# Altium footprint library Elettronica FM.PcbLib: 387 footprints (part 10 of 25)
Each footprint in its own frame and in the unit in brackets; x right, y up, seen from the top. Pads: shape width x height; smd on the part's side, far side on the other; paste and mask are expansions set on the pad; w line width, h text height; cw(c..) or ccw(c..) is an arc to the next point about the centre after c.
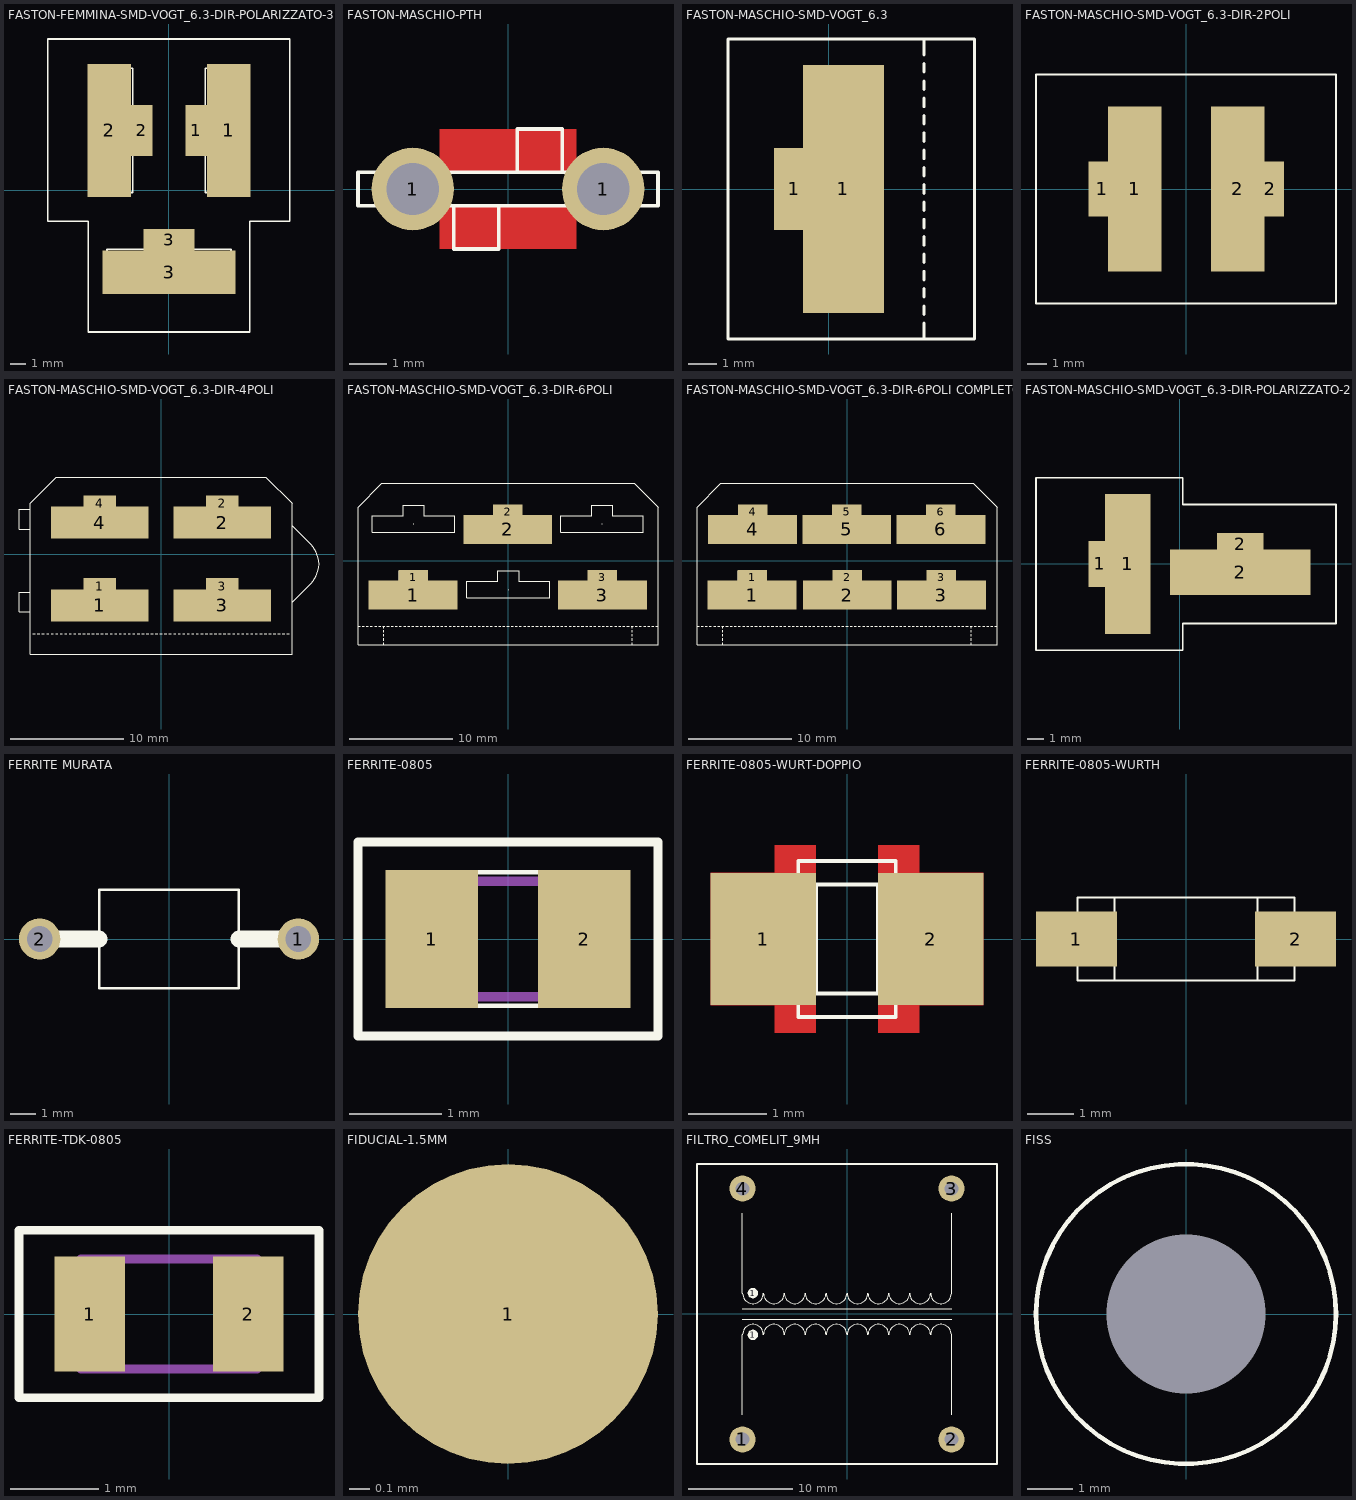
[diagram p9: the footprints below, top view; thin cyan lines are the x and y axes]

## FASTON-FEMMINA-SMD-VOGT_6.3-DIR-POLARIZZATO-3POLI [mm]
height 40.5
pads (9):
  round 0.1 on Top Overlay mask+0.1: 0(3.15,3.85) 1(-3.15,3.85) 1(0,-4.6)
  rect 1.4x3.3 smd paste-5 mask+0.1: 1(1.75,3.85) 2(-1.75,3.85)
  rect 2.8x8.6 smd paste-5 mask+0.1: 1(3.85,3.85) 2(-3.85,3.85)
  rect 8.6x2.8 smd paste-5 mask+0.1: 3(0,-5.3)
  rect 3.3x1.4 smd paste-5 mask+0.1: 3(0,-3.2)
Top Overlay:
  lines w0.1: -3.55,2.5 -4.95,2.5 -4.95,1.525 -4.45,1.525 cw(c-4.45,1.175) -4.45,0.825 -4.95,0.825 -4.95,-0.15 -3.55,-0.15 ; -3.55,5.2 -4.95,5.2 -4.95,6.175 -4.45,6.175 ccw(c-4.45,6.525) -4.45,6.875 -4.95,6.875 -4.95,7.85 -3.55,7.85 ; -2.75,2.525 -1.35,2.525 -1.35,3.5 -1.85,3.5 cw(c-1.85,3.85) -1.85,4.2 -1.35,4.2 -1.35,5.175 -2.75,5.175 ; -1.35,-5 -1.35,-6.4 -2.325,-6.4 -2.325,-5.9 ccw(c-2.675,-5.9) -3.025,-5.9 -3.025,-6.4 -4,-6.4 -4,-5 ; -1.325,-4.2 -1.325,-2.8 -0.35,-2.8 -0.35,-3.3 ccw(c0,-3.3) 0.35,-3.3 0.35,-2.8 1.325,-2.8 1.325,-4.2 ; 1.35,-5 1.35,-6.4 2.325,-6.4 2.325,-5.9 cw(c2.675,-5.9) 3.025,-5.9 3.025,-6.4 4,-6.4 4,-5 ; 2.35,2.85 1.35,2.85 1.35,4.85 2.35,4.85 ; 2.35,2.85 2.35,-0.15 3.95,-0.15 3.95,7.85 2.35,7.85 2.35,4.85 ; 2.75,2.525 1.35,2.525 1.35,3.5 1.85,3.5 ccw(c1.85,3.85) 1.85,4.2 1.35,4.2 1.35,5.175 2.75,5.175 ; 3.55,2.5 4.95,2.5 4.95,1.525 4.45,1.525 ccw(c4.45,1.175) 4.45,0.825 4.95,0.825 4.95,-0.15 3.55,-0.15 ; 3.55,5.2 4.95,5.2 4.95,6.175 4.45,6.175 cw(c4.45,6.525) 4.45,6.875 4.95,6.875 4.95,7.85 3.55,7.85 ; -4,-5 -4,-4.2 ; -4,-5 4,-5 ; -4,-5 -4,-4.2 ; -4,-4.2 4,-4.2 ; -3.55,-0.15 -2.75,-0.15 ; -3.55,-0.15 -3.55,7.85 ; -3.55,-0.15 -2.75,-0.15 ; -3.55,7.85 -2.75,7.85 ; -3.55,7.85 -2.75,7.85 ; -2.75,-0.15 -2.75,7.85 ; 2.75,-0.15 3.55,-0.15 ; 2.75,-0.15 2.75,7.85 ; 2.75,-0.15 3.55,-0.15 ; 2.75,7.85 3.55,7.85 ; 2.75,7.85 3.55,7.85 ; 3.55,-0.15 3.55,7.85 ; 4,-5 4,-4.2 ; 4,-5 4,-4.2 ; -7.825,-2 -5.2,-2 -5.2,-9.15 5.2,-9.15 5.2,-2 7.8,-2 7.8,9.75 -7.825,9.75 -7.825,-2 ; -4,-5.4 4,-5.4 4,-3.8 1,-3.8 1,-2.8 -1,-2.8 -1,-3.8 -4,-3.8 -4,-5.4 ; -3.95,-0.15 -2.35,-0.15 -2.35,2.85 -1.35,2.85 -1.35,4.85 -2.35,4.85 -2.35,7.85 -3.95,7.85 -3.95,-0.15
3D body "c-180941-p5-3d.stp": height 24.3, standoff 1.5, extent -7.6,-8.95 7.6,9.55
3D body "450.STEP": height 10.3, standoff 0, extent -5,-0.15 -1.3,7.85
3D body "450.STEP": height 10.3, standoff 0, extent 1.3,-0.15 5,7.85
3D body "450.STEP": height 10.3, standoff 0, extent -4,-6.45 4,-2.75

## FASTON-MASCHIO-PTH [mm]
height 40.5
pads (2):
  round 2.2 hole 1.4 paste+0 mask+0.05: 1(-2.54,0) 1(2.54,0)
Top Layer:
  pour cut-out: -1.825,0.45 -1.825,1.6 1.825,1.6 1.825,0.45
  pour cut-out: 1.825,-0.45 1.825,-1.6 -1.825,-1.6 -1.825,-0.45
Top Overlay:
  lines w0.1: -1.825,-0.45 -1.825,-0.3 ; -1.825,-0.075 -1.825,0.075 ; -1.825,0.3 -1.825,0.45 ; -1.45,-0.45 -1.45,-1.6 -0.25,-1.6 -0.25,-0.45 ; 0.25,0.45 0.25,1.6 1.45,1.6 1.45,0.45 ; 1.825,-0.45 1.825,-0.3 ; 1.825,-0.075 1.825,0.075 ; 1.825,0.3 1.825,0.45 ; -3.25,-0.45 -4,-0.45 -4,0.45 -3.25,0.45 ; -3.25,-0.45 3.25,-0.45 ; -3.25,-0.45 -3.25,0.45 ; -3.25,0.45 3.25,0.45 ; 3.25,-0.45 4,-0.45 4,0.45 3.25,0.45 ; 3.25,-0.45 3.25,0.45
3D body "c-1217861-1-h-3d.stp": height 10.55, standoff -3.47, extent -3.962,-1.543 3.963,1.543

## FASTON-MASCHIO-SMD-VOGT_6.3 [mm]
height 40.5
pads (3):
  rect 1.4x2.85 smd paste-5 mask-50: 1(-1.2,0)
  rect 2.8x8.6 smd paste-5 mask-50: 1(0.5,0)
  round 0.1 on Top Overlay mask+0.1: 2(0,0)
Top Overlay:
  lines w0.1: -0.425,-1.325 -1.825,-1.325 -1.825,-0.35 -1.325,-0.35 ccw(c-1.325,0) -1.325,0.35 -1.825,0.35 -1.825,1.325 -0.425,1.325 ; 0.375,-1.35 1.775,-1.35 1.775,-2.325 1.275,-2.325 ccw(c1.275,-2.675) 1.275,-3.025 1.775,-3.025 1.775,-4 0.375,-4 ; 0.375,1.35 1.775,1.35 1.775,2.325 1.275,2.325 cw(c1.275,2.675) 1.275,3.025 1.775,3.025 1.775,4 0.375,4 ; 3.3,-4.65 3.3,-5.2 ; 3.3,-4.35 3.3,-4.05 ; 3.3,-3.75 3.3,-3.45 ; 3.3,-3.15 3.3,-2.85 ; 3.3,-2.55 3.3,-2.25 ; 3.3,-1.95 3.3,-1.65 ; 3.3,-1.35 3.3,-1.05 ; 3.3,-0.75 3.3,-0.45 ; 3.3,-0.15 3.3,0.15 ; 3.3,0.45 3.3,0.75 ; 3.3,1.05 3.3,1.35 ; 3.3,1.65 3.3,1.95 ; 3.3,2.25 3.3,2.55 ; 3.3,2.85 3.3,3.15 ; 3.3,3.45 3.3,3.75 ; 3.3,4.05 3.3,4.35 ; 3.3,4.65 3.3,5.2 ; -0.425,-4 0.375,-4 ; -0.425,-4 0.375,-4 ; -0.425,-4 -0.425,4 ; -0.425,4 0.375,4 ; -0.425,4 0.375,4 ; 0.375,-4 0.375,4 ; 3.3,-5.2 5.05,-5.2 5.05,5.2 3.3,5.2 ; 3.3,-5.2 -3.5,-5.2 -3.5,5.2 3.3,5.2
Top Paste:
  region: -0.9,4.3 1.9,4.3 1.9,-4.3 -0.9,-4.3 -0.9,-1.425 -1.9,-1.425 -1.9,1.4 -1.9,1.425 -1.875,1.425 -0.9,1.425
Top Solder:
  region: -1.95,1.475 -1,1.475 -1,4.4 1.95,4.4 1.95,-4.4 -1,-4.4 -1,-1.475 -1.95,-1.475
3D body "c-0480054-03-3-u-3d.stp": height 25.5, standoff 1.5, extent -3.303,-4.994 4.825,4.975
3D body "450.STEP": height 10.3, standoff 0, extent -1.825,-4 1.875,4

## FASTON-MASCHIO-SMD-VOGT_6.3-DIR-2POLI [mm]
height 40.5
pads (6):
  rect 1.4x2.85 smd paste-5 mask-50: 1(-4.363,0) 2(4.387,0)
  rect 2.8x8.6 smd paste-5 mask-50: 1(-2.663,0) 2(2.687,0)
  round 0.1 on Top Overlay mask+0.1: 2(-3.163,0) 2(3.187,0)
Top Overlay:
  lines w0.1: -3.587,-1.325 -4.987,-1.325 -4.987,-0.35 -4.487,-0.35 ccw(c-4.487,0) -4.487,0.35 -4.987,0.35 -4.987,1.325 -3.587,1.325 ; -2.787,-1.35 -1.387,-1.35 -1.387,-2.325 -1.887,-2.325 ccw(c-1.887,-2.675) -1.887,-3.025 -1.387,-3.025 -1.387,-4 -2.787,-4 ; -2.787,1.35 -1.387,1.35 -1.387,2.325 -1.887,2.325 cw(c-1.887,2.675) -1.887,3.025 -1.387,3.025 -1.387,4 -2.787,4 ; 2.787,-1.35 1.387,-1.35 1.387,-2.325 1.887,-2.325 cw(c1.887,-2.675) 1.887,-3.025 1.387,-3.025 1.387,-4 2.787,-4 ; 2.787,1.35 1.387,1.35 1.387,2.325 1.887,2.325 ccw(c1.887,2.675) 1.887,3.025 1.387,3.025 1.387,4 2.787,4 ; 3.587,-1.325 4.987,-1.325 4.987,-0.35 4.487,-0.35 cw(c4.487,0) 4.487,0.35 4.987,0.35 4.987,1.325 3.587,1.325 ; -3.587,-4 -3.587,4 ; -3.587,-4 -2.787,-4 ; -3.588,-4 -2.788,-4 ; -3.587,4 -2.787,4 ; -3.588,4 -2.788,4 ; -2.787,-4 -2.787,4 ; -2.363,1 -2.363,4 -3.963,4 -3.963,-4 -2.363,-4 -2.363,-1 -1.362,-1 -1.362,1 -2.362,1 ; -2.363,1 -2.362,1 ; 2.787,-4 3.587,-4 ; 2.787,-4 2.787,4 ; 2.788,-4 3.588,-4 ; 2.787,4 3.587,4 ; 2.788,4 3.588,4 ; 3.587,-4 3.587,4 ; -7.8,-5.95 7.8,-5.95 7.8,5.95 -7.8,5.95 -7.8,-5.95 ; 2.387,-4 3.987,-4 3.987,-1 4.988,-1 4.988,1 3.988,1 3.987,4 2.387,4 2.387,-4
Top Paste:
  region: 4.087,-4.3 1.287,-4.3 1.287,4.3 4.087,4.3 4.087,1.425 5.087,1.425 5.087,-1.4 5.087,-1.425 5.062,-1.425 4.087,-1.425
  region: -4.063,-4.3 -1.263,-4.3 -1.263,4.3 -4.063,4.3 -4.063,1.425 -5.063,1.425 -5.063,-1.4 -5.063,-1.425 -5.038,-1.425 -4.063,-1.425
Top Solder:
  region: 5.137,-1.475 4.187,-1.475 4.187,-4.4 1.237,-4.4 1.237,4.4 4.187,4.4 4.187,1.475 5.137,1.475
  region: -5.113,-1.475 -4.163,-1.475 -4.163,-4.4 -1.213,-4.4 -1.213,4.4 -4.163,4.4 -4.163,1.475 -5.113,1.475
3D body "450.STEP": height 10.3, standoff 0, extent -5.037,-4 -1.337,4
3D body "450.STEP": height 10.3, standoff 0, extent 1.337,-4 5.037,4
3D body "c-180923-ah-3d.stp": height 24.4, standoff 1.5, extent -7.6,-5.75 7.6,5.75

## FASTON-MASCHIO-SMD-VOGT_6.3-DIR-4POLI [mm]
height 40.5
pads (16):
  rect 2.85x1.4 smd paste-5 mask-50: 1(-5.4,-2.8) 2(5.4,4.5) 3(5.4,-2.8) 4(-5.4,4.5)
  rect 8.6x2.8 smd paste-5 mask-50: 1(-5.4,-4.5) 2(5.4,2.8) 3(5.4,-4.5) 4(-5.4,2.8)
  round 0.1 on Top Overlay mask+0.1: 2(-5.4,-4) 2(-5.4,-4) 2(-5.4,3.3) 2(5.4,-4) 2(5.4,-4) 2(5.4,-4) 2(5.4,3.3) 2(5.4,3.3)
Top Overlay:
  drawing of 212 lines, arcs and shapes, not listed
Top Paste:
  region: -1.1,4.2 -1.1,1.4 -9.7,1.4 -9.7,4.2 -6.825,4.2 -6.825,5.2 -4,5.2 -3.975,5.2 -3.975,5.175 -3.975,4.2
  region: 9.7,4.2 9.7,1.4 1.1,1.4 1.1,4.2 3.975,4.2 3.975,5.2 6.8,5.2 6.825,5.2 6.825,5.175 6.825,4.2
  region: -1.1,-3.1 -1.1,-5.9 -9.7,-5.9 -9.7,-3.1 -6.825,-3.1 -6.825,-2.1 -4,-2.1 -3.975,-2.1 -3.975,-2.125 -3.975,-3.1
  region: 9.7,-3.1 9.7,-5.9 1.1,-5.9 1.1,-3.1 3.975,-3.1 3.975,-2.1 6.8,-2.1 6.825,-2.1 6.825,-2.125 6.825,-3.1
Top Solder:
  region: -3.925,5.25 -3.925,4.3 -1,4.3 -1,1.35 -9.8,1.35 -9.8,4.3 -6.875,4.3 -6.875,5.25
  region: 6.875,5.25 6.875,4.3 9.8,4.3 9.8,1.35 1,1.35 1,4.3 3.925,4.3 3.925,5.25
  region: -3.925,-2.05 -3.925,-3 -1,-3 -1,-5.95 -9.8,-5.95 -9.8,-3 -6.875,-3 -6.875,-2.05
  region: 6.875,-2.05 6.875,-3 9.8,-3 9.8,-5.95 1,-5.95 1,-3 3.925,-3 3.925,-2.05
3D body "c-880110-f-3d.stp": height 25.65, standoff 1.5, extent -12.315,-8.72 13.715,6.72
3D body "450.STEP": height 10.3, standoff 0, extent -9.4,1.45 -1.4,5.15
3D body "450.STEP": height 10.3, standoff 0, extent 1.4,1.45 9.4,5.15
3D body "450.STEP": height 10.3, standoff 0, extent -9.4,-5.85 -1.4,-2.15
3D body "450.STEP": height 10.3, standoff 0, extent 1.4,-5.85 9.4,-2.15

## FASTON-MASCHIO-SMD-VOGT_6.3-DIR-6POLI [mm]
height 40.5
pads (12):
  rect 2.85x1.4 smd paste-5 mask-50: 1(-9.175,-1.625) 2(-0.025,4.725) 3(9.125,-1.625)
  rect 8.6x2.8 smd paste-5 mask-50: 1(-9.175,-3.325) 2(-0.025,3.025) 3(9.125,-3.325)
  round 0.1 on Top Overlay mask+0.1: 2(-9.175,-2.825) 2(-9.125,3.525) 2(-0.025,3.525) 2(0.025,-2.825) 2(9.075,3.525) 2(9.125,-2.825)
Top Overlay:
  drawing of 218 lines, arcs and shapes, not listed
Top Paste:
  region: 13.425,-1.925 13.425,-4.725 4.825,-4.725 4.825,-1.925 7.7,-1.925 7.7,-0.925 10.525,-0.925 10.55,-0.925 10.55,-0.95 10.55,-1.925
  region: 4.275,4.425 4.275,1.625 -4.325,1.625 -4.325,4.425 -1.45,4.425 -1.45,5.425 1.375,5.425 1.4,5.425 1.4,5.4 1.4,4.425
  region: -4.875,-1.925 -4.875,-4.725 -13.475,-4.725 -13.475,-1.925 -10.6,-1.925 -10.6,-0.925 -7.775,-0.925 -7.75,-0.925 -7.75,-0.95 -7.75,-1.925
Top Solder:
  region: 10.6,-0.875 10.6,-1.825 13.525,-1.825 13.525,-4.775 4.725,-4.775 4.725,-1.825 7.65,-1.825 7.65,-0.875
  region: 1.45,5.475 1.45,4.525 4.375,4.525 4.375,1.575 -4.425,1.575 -4.425,4.525 -1.5,4.525 -1.5,5.475
  region: -7.7,-0.875 -7.7,-1.825 -4.775,-1.825 -4.775,-4.775 -13.575,-4.775 -13.575,-1.825 -10.65,-1.825 -10.65,-0.875
3D body "450.STEP": height 10.3, standoff 0, extent 5.125,-4.675 13.125,-0.975
3D body "450.STEP": height 10.3, standoff 0, extent -13.175,-4.675 -5.175,-0.975
3D body "450.STEP": height 10.3, standoff 0, extent -4.025,1.675 3.975,5.375
3D body "c-280314-l1-3d.stp": height 25.7, standoff 1.5, extent -14.25,-8.025 14.25,7.375

## FASTON-MASCHIO-SMD-VOGT_6.3-DIR-6POLI COMPLETO [mm]
height 40.5
pads (18):
  rect 2.85x1.4 smd paste-5 mask-50: 1(-9.175,-1.625) 2(0.025,-1.625) 3(9.125,-1.625) 4(-9.125,4.725) 5(-0.025,4.725) 6(9.075,4.725)
  rect 8.6x2.8 smd paste-5 mask-50: 1(-9.175,-3.325) 2(0.025,-3.325) 3(9.125,-3.325) 4(-9.125,3.025) 5(-0.025,3.025) 6(9.075,3.025)
  round 0.1 on Top Overlay mask+0.1: 2(-9.175,-2.825) 2(-9.125,3.525) 2(-0.025,3.525) 2(0.025,-2.825) 2(9.075,3.525) 2(9.125,-2.825)
Top Overlay:
  drawing of 287 lines, arcs and shapes, not listed
Top Paste:
  region: -4.875,-1.925 -4.875,-4.725 -13.475,-4.725 -13.475,-1.925 -10.6,-1.925 -10.6,-0.925 -7.775,-0.925 -7.75,-0.925 -7.75,-0.95 -7.75,-1.925
  region: 4.275,4.425 4.275,1.625 -4.325,1.625 -4.325,4.425 -1.45,4.425 -1.45,5.425 1.375,5.425 1.4,5.425 1.4,5.4 1.4,4.425
  region: 13.425,-1.925 13.425,-4.725 4.825,-4.725 4.825,-1.925 7.7,-1.925 7.7,-0.925 10.525,-0.925 10.55,-0.925 10.55,-0.95 10.55,-1.925
Top Solder:
  region: -7.7,-0.875 -7.7,-1.825 -4.775,-1.825 -4.775,-4.775 -13.575,-4.775 -13.575,-1.825 -10.65,-1.825 -10.65,-0.875
  region: 1.45,5.475 1.45,4.525 4.375,4.525 4.375,1.575 -4.425,1.575 -4.425,4.525 -1.5,4.525 -1.5,5.475
  region: 10.6,-0.875 10.6,-1.825 13.525,-1.825 13.525,-4.775 4.725,-4.775 4.725,-1.825 7.65,-1.825 7.65,-0.875
  region: -7.65,5.475 -7.65,4.525 -4.725,4.525 -4.725,1.575 -13.525,1.575 -13.525,4.525 -10.6,4.525 -10.6,5.475
  region: 1.5,-0.875 1.5,-1.825 4.425,-1.825 4.425,-4.775 -4.375,-4.775 -4.375,-1.825 -1.45,-1.825 -1.45,-0.875
  region: 10.55,5.475 10.55,4.525 13.475,4.525 13.475,1.575 4.675,1.575 4.675,4.525 7.6,4.525 7.6,5.475
3D body "450.STEP": height 10.3, standoff 0, extent 5.075,1.675 13.075,5.375
3D body "450.STEP": height 10.3, standoff 0, extent -13.125,1.675 -5.125,5.375
3D body "450.STEP": height 10.3, standoff 0, extent -3.975,-4.675 4.025,-0.975
3D body "c-280314-l1-3d.stp": height 25.7, standoff 1.5, extent -14.25,-8.025 14.25,7.375
3D body "450.STEP": height 10.3, standoff 0, extent -4.025,1.675 3.975,5.375
3D body "450.STEP": height 10.3, standoff 0, extent -13.175,-4.675 -5.175,-0.975
3D body "450.STEP": height 10.3, standoff 0, extent 5.125,-4.675 13.125,-0.975

## FASTON-MASCHIO-SMD-VOGT_6.3-DIR-POLARIZZATO-2POLI [mm]
height 40.5
pads (6):
  rect 1.4x2.85 smd paste-5 mask-50: 1(-4.9,0)
  rect 2.8x8.6 smd paste-5 mask-50: 1(-3.2,0)
  round 0.1 on Top Overlay mask+0.1: 2(-3.7,0) 2(3.7,0)
  rect 2.85x1.4 smd paste-5 mask-50: 2(3.7,1.2)
  rect 8.6x2.8 smd paste-5 mask-50: 2(3.7,-0.5)
Top Overlay:
  lines w0.1: -4.125,-1.325 -5.525,-1.325 -5.525,-0.35 -5.025,-0.35 ccw(c-5.025,0) -5.025,0.35 -5.525,0.35 -5.525,1.325 -4.125,1.325 ; -3.325,-1.35 -1.925,-1.35 -1.925,-2.325 -2.425,-2.325 ccw(c-2.425,-2.675) -2.425,-3.025 -1.925,-3.025 -1.925,-4 -3.325,-4 ; -3.325,1.35 -1.925,1.35 -1.925,2.325 -2.425,2.325 cw(c-2.425,2.675) -2.425,3.025 -1.925,3.025 -1.925,4 -3.325,4 ; 2.35,-0.4 2.35,-1.8 1.375,-1.8 1.375,-1.3 ccw(c1.025,-1.3) 0.675,-1.3 0.675,-1.8 -0.3,-1.8 -0.3,-0.4 ; 2.375,0.4 2.375,1.8 3.35,1.8 3.35,1.3 ccw(c3.7,1.3) 4.05,1.3 4.05,1.8 5.025,1.8 5.025,0.4 ; 5.05,-0.4 5.05,-1.8 6.025,-1.8 6.025,-1.3 cw(c6.375,-1.3) 6.725,-1.3 6.725,-1.8 7.7,-1.8 7.7,-0.4 ; -4.125,-4 -3.325,-4 ; -4.125,-4 -3.325,-4 ; -4.125,-4 -4.125,4 ; -4.125,4 -3.325,4 ; -4.125,4 -3.325,4 ; -3.325,-4 -3.325,4 ; -2.9,1 -1.9,1 -1.9,-1 -2.9,-1 -2.9,-4 -4.5,-4 -4.5,4 -2.9,4 -2.9,1 ; -2.9,1 -2.9,1 ; -0.3,-0.4 -0.3,0.4 ; -0.3,-0.4 7.7,-0.4 ; -0.3,-0.4 -0.3,0.4 ; -0.3,0.4 7.7,0.4 ; 7.7,-0.4 7.7,0.4 ; 7.7,-0.4 7.7,0.4 ; -8.825,-5.3 0.175,-5.3 0.175,-3.65 9.575,-3.65 9.575,3.65 0.175,3.65 0.175,5.3 -8.825,5.3 -8.825,-5.3 ; -0.3,-0.8 7.7,-0.8 7.7,0.8 4.7,0.8 4.7,1.8 2.7,1.8 2.7,0.8 -0.3,0.8 -0.3,-0.8
Top Paste:
  region: 8,0.9 8,-1.9 -0.6,-1.9 -0.6,0.9 2.275,0.9 2.275,1.9 5.1,1.9 5.125,1.9 5.125,1.875 5.125,0.9
  region: -4.6,4.3 -1.8,4.3 -1.8,-4.3 -4.6,-4.3 -4.6,-1.425 -5.6,-1.425 -5.6,1.4 -5.6,1.425 -5.575,1.425 -4.6,1.425
Top Solder:
  region: 5.175,1.95 5.175,1 8.1,1 8.1,-1.95 -0.7,-1.95 -0.7,1 2.225,1 2.225,1.95
  region: -5.65,1.475 -4.7,1.475 -4.7,4.4 -1.75,4.4 -1.75,-4.4 -4.7,-4.4 -4.7,-1.475 -5.65,-1.475
3D body "450.STEP": height 10.3, standoff 0, extent -0.3,-1.85 7.7,1.85
3D body "450.STEP": height 10.3, standoff 0, extent -5.575,-4 -1.875,4
3D body "c-180907-aa-3d.stp": height 24.4, standoff 1.48, extent -8.625,-5.1 9.375,5.1

## FERRITE MURATA [mm]
height 8.5
pads (2):
  round 1.6 hole 1: 1(5,0) 2(-5,0)
Top Overlay:
  lines w0.1: -2.7,-1.9 -2.7,1.9 2.7,1.9 2.7,-1.9 -2.7,-1.9
  lines w0.65: -5,0 -2.7,0 ; 2.7,0 5,0

## FERRITE-0805 [mm]
height 1.9
pads (2):
  rect 1x1.5 smd paste-5: 1(-0.825,0) 2(0.825,0)
Top Overlay:
  lines w0.05: -0.5,-0.725 -0.5,0.725 ; 0.5,-0.725 0.5,0.725 ; -1.1,-0.725 -1.1,0.725 1.1,0.725 1.1,-0.725 -1.1,-0.725
  lines w0.1: -1.625,-1.05 -1.625,1.05 1.625,1.05 1.625,-1.05 -1.625,-1.05
Mechanical 3:
  lines w0.1: -1,-0.625 -1,0.625 1,0.625 1,-0.625 -1,-0.625
3D body "res0805.STEP": height 0.5, standoff 0, extent -1,-0.625 1,0.625

## FERRITE-0805-WURT-DOPPIO [mm]
height 1.9
pads (2):
  rect 1.35x1.7 smd paste-5: 1(-1.075,0) 2(1.075,0)
Top Layer:
  region: 0.4,1.2 0.925,1.2 0.925,0.85 1.75,0.85 1.75,-0.85 0.925,-0.85 0.925,-1.2 0.4,-1.2
  region: -0.4,1.2 -0.925,1.2 -0.925,0.85 -1.75,0.85 -1.75,-0.85 -0.925,-0.85 -0.925,-1.2 -0.4,-1.2
Top Overlay:
  lines w0.05: -0.4,-0.7 -0.4,0.7 ; 0.4,-0.7 0.4,0.7 ; -1.1,-0.7 1.1,-0.7 1.1,0.7 -1.1,0.7 -1.1,-0.7 ; -0.625,-1 -0.625,1 0.625,1 0.625,-1 -0.625,-1
Top Solder:
  region: 0.3,1.3 0.3,-1.3 1.025,-1.3 1.025,-0.95 1.85,-0.95 1.85,0.95 1.025,0.95 1.025,1.3
  region: -0.3,1.3 -0.3,-1.3 -1.025,-1.3 -1.025,-0.95 -1.85,-0.95 -1.85,0.95 -1.025,0.95 -1.025,1.3
3D body "res1206r.STEP": height 0.55, standoff 0, extent -1.55,-0.8 1.55,0.8
3D body "res0805.STEP": height 0.5, standoff 0, extent -0.625,-1 0.625,1
3D body: height 1.1, standoff 0, extent -1.1,-0.7 1.1,0.7
3D body: height 1.12, standoff 0, extent -1.125,-0.725 -0.4,0.725
3D body: height 1.12, standoff 0, extent 0.4,-0.725 1.125,0.725

## FERRITE-0805-WURTH [mm]
height 1.9
pads (2):
  rect 1.75x1.2 smd paste-5: 1(-2.375,0) 2(2.375,0)
Top Overlay:
  lines w0.05: -1.55,-0.9 -1.55,0.9 ; 1.55,-0.9 1.55,0.9 ; -2.35,-0.9 2.35,-0.9 2.35,0.9 -2.35,0.9 -2.35,-0.9
3D body: height 1.8, standoff 0, extent -2.35,-0.9 2.35,0.9
3D body: height 1.63, standoff 0, extent 1.55,-0.925 2.375,0.925
3D body: height 1.63, standoff 0, extent -2.375,-0.925 -1.55,0.925

## FERRITE-TDK-0805 [mm]
height 1.9
pads (2):
  rect 0.8x1.3 smd paste-5: 1(-0.9,0) 2(0.9,0)
Top Overlay:
  lines w0.1: -1.7,-0.95 -1.7,0.95 1.7,0.95 1.7,-0.95 -1.7,-0.95
Top Paste:
  region: 1.25,0.6 0.8,0.6 0.55,0 0.8,-0.6 1.25,-0.6
  region: -1.25,0.6 -0.8,0.6 -0.55,0 -0.8,-0.6 -1.25,-0.6
Mechanical 3:
  lines w0.1: -1,-0.625 -1,0.625 1,0.625 1,-0.625 -1,-0.625
3D body "res0805.STEP": height 0.5, standoff 0, extent -1,-0.625 1,0.625

## FIDUCIAL-1.5MM [mm]
height 1.9
pads (1):
  round 1.5 smd mask+0.5: 1(0,0)

## FILTRO_COMELIT_9MH [mm]
height 4.8
pads (6):
  round 2.5 hole 1.3: 1(-10,-12) 2(10,-12) 3(10,12) 4(-10,12)
  round 1 on Top Overlay mask+0.1: 1(-9,-2) 1(-9,2)
Top Overlay:
  lines w0.1: -10,-9.625 -10,-2 cw(c-9,-2) -8,-2 cw(c-7,-2) -6,-2 cw(c-5,-2) -4,-2 cw(c-3,-2) -2,-2 cw(c-1,-2) 0,-2 cw(c1,-2) 2,-2 cw(c3,-2) 4,-2 cw(c5,-2) 6,-2 cw(c7,-2) 8,-2 cw(c9,-2) 10,-2 10,-9.625 ; -10,-0.5 10,-0.5 ; -10,0.5 10,0.5 ; -10,9.625 -10,2 ccw(c-9,2) -8,2 ccw(c-7,2) -6,2 ccw(c-5,2) -4,2 ccw(c-3,2) -2,2 ccw(c-1,2) 0,2 ccw(c1,2) 2,2 ccw(c3,2) 4,2 ccw(c5,2) 6,2 ccw(c7,2) 8,2 ccw(c9,2) 10,2 10,9.625
  lines w0.2: -14.35,-14.35 14.35,-14.35 14.35,14.35 -14.35,14.35 -14.35,-14.35
3D body "filtro_mainboard.stp": height 20.6, standoff -2.3, extent -14.35,-14.35 14.35,14.35

## FISS [mm]
height 1.9
pads (1):
  round 0 hole 3.5 unplated: 1(0,0)
Top Overlay:
  circle w0.1: c0,0 r3.3